# Altium footprint library 6-Connectors-4.PcbLib: 166 footprints (part 2 of 12)
Each footprint in its own frame and in the unit in brackets; x right, y up, seen from the top. Pads: shape width x height; smd on the part's side, far side on the other; paste and mask are expansions set on the pad; w line width, h text height; cw(c..) or ccw(c..) is an arc to the next point about the centre after c.
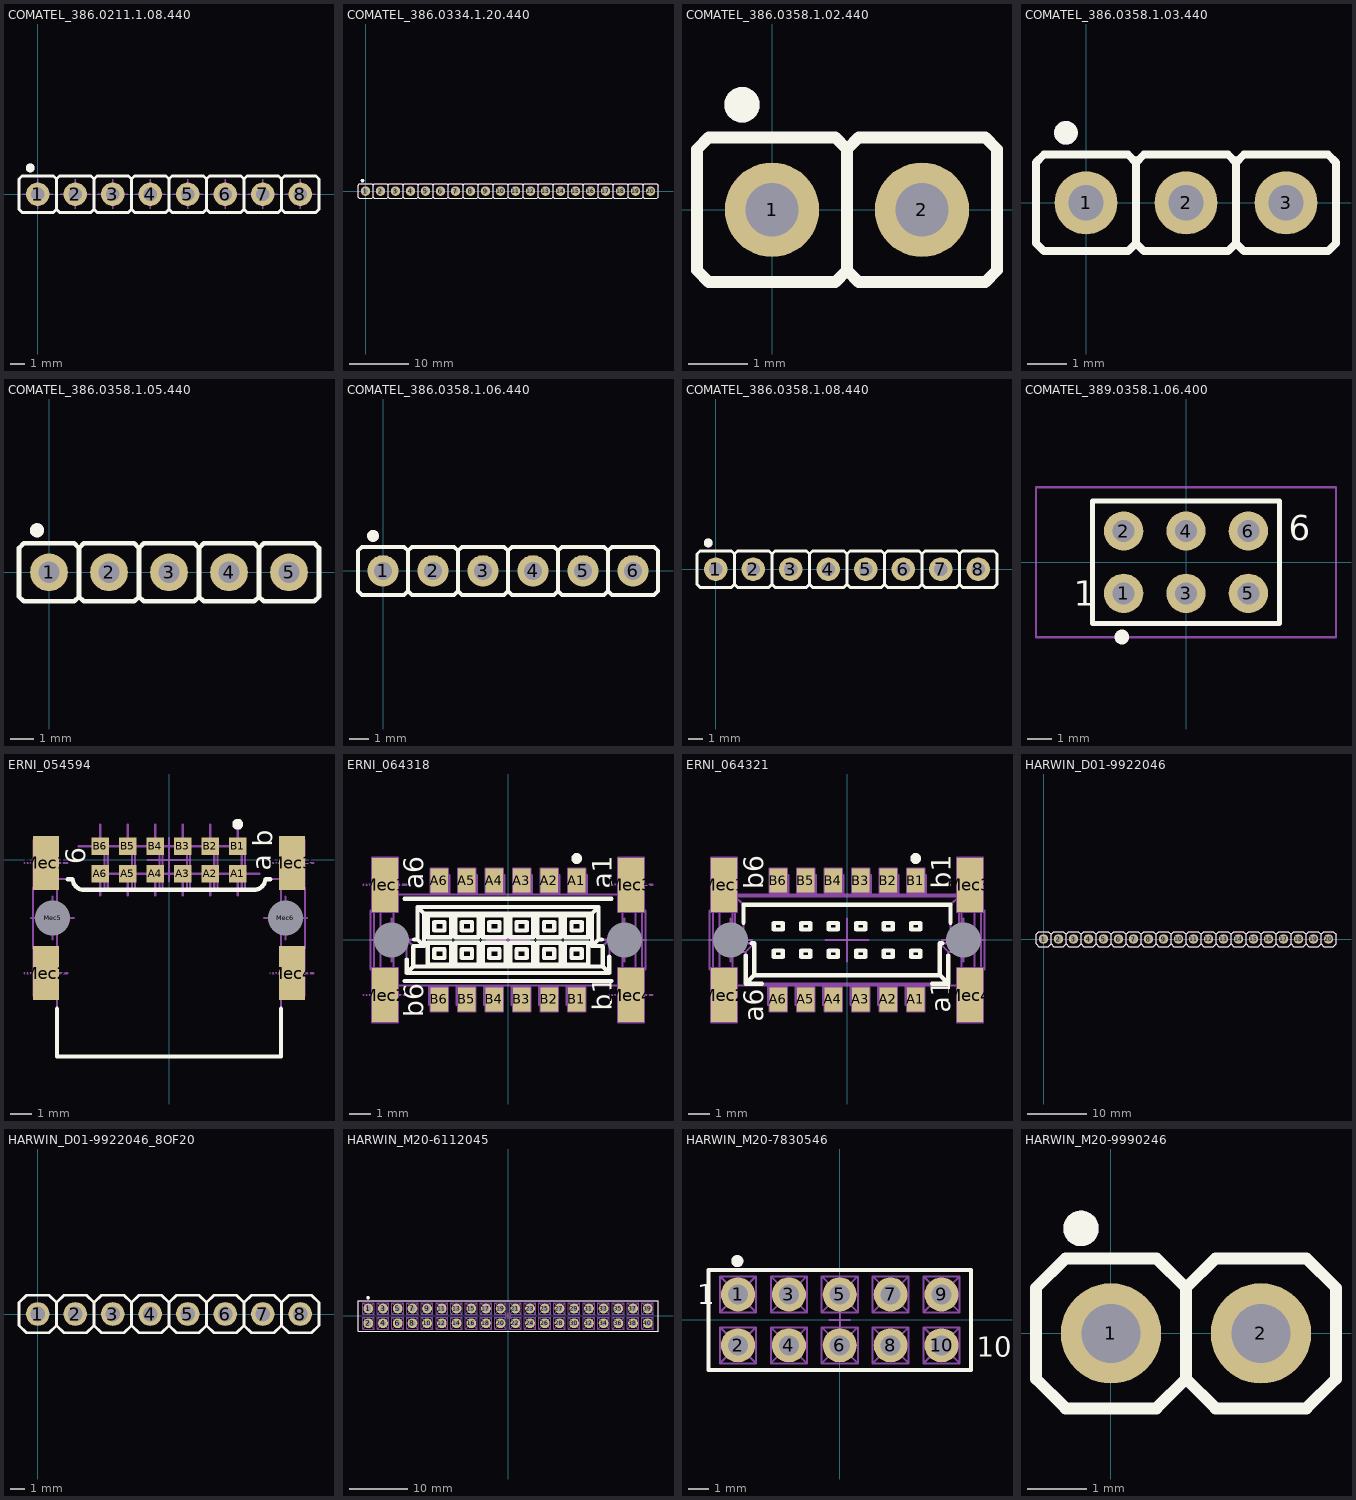
[diagram p1: the footprints below, top view; thin cyan lines are the x and y axes]

## COMATEL_386.0211.1.08.440 [mm] "Wire-Wrap contact (Pin Length= 16.5mm)"
height 18.2
pads (8):
  round 1.6 hole 0.9: 1(0,0) 2(2.54,0) 3(5.08,0) 4(7.62,0) 5(10.16,0) 6(12.7,0) 7(15.24,0) 8(17.78,0)
Top Overlay:
  circle w0.3: c-0.508,1.778 r0.15
  lines w0.2: 1.27,-1.025 1.27,1.025 ; 1.27,-1.025 1.47,-1.225 3.61,-1.225 3.81,-1.025 ; 1.27,-1.025 1.27,1.025 ; 1.27,-1.025 1.07,-1.225 -1.07,-1.225 -1.27,-1.025 -1.27,1.025 -1.07,1.225 1.07,1.225 1.27,1.025 ; 1.27,1.025 1.47,1.225 3.61,1.225 3.81,1.025 ; 3.81,-1.025 3.81,1.025 ; 3.81,-1.025 4.01,-1.225 6.15,-1.225 6.35,-1.025 ; 3.81,-1.025 3.81,1.025 ; 3.81,1.025 4.01,1.225 6.15,1.225 6.35,1.025 ; 6.35,-1.025 6.35,1.025 ; 6.35,-1.025 6.55,-1.225 8.69,-1.225 8.89,-1.025 ; 6.35,-1.025 6.35,1.025 ; 6.35,1.025 6.55,1.225 8.69,1.225 8.89,1.025 ; 8.89,-1.025 8.89,1.025 ; 8.89,-1.025 9.09,-1.225 11.23,-1.225 11.43,-1.025 ; 8.89,-1.025 8.89,1.025 ; 8.89,1.025 9.09,1.225 11.23,1.225 11.43,1.025 ; 11.43,-1.025 11.43,1.025 ; 11.43,-1.025 11.63,-1.225 13.77,-1.225 13.97,-1.025 ; 11.43,-1.025 11.43,1.025 ; 11.43,1.025 11.63,1.225 13.77,1.225 13.97,1.025 ; 13.97,-1.025 13.97,1.025 ; 13.97,-1.025 14.17,-1.225 16.31,-1.225 16.51,-1.025 ; 13.97,-1.025 13.97,1.025 ; 13.97,1.025 14.17,1.225 16.31,1.225 16.51,1.025 ; 16.51,-1.025 16.51,1.025 ; 16.51,-1.025 16.71,-1.225 18.85,-1.225 19.05,-1.025 19.05,1.025 18.85,1.225 16.71,1.225 16.51,1.025 ; 16.51,-1.025 16.51,1.025
Mechanical 8:
  lines w0.1: -1,0 0,0 ; 0,-1 0,0 ; 0,1 0,0 ; 1,0 0,0 ; 1.54,0 2.54,0 ; 2.54,-1 2.54,0 ; 2.54,1 2.54,0 ; 3.54,0 2.54,0 ; 4.08,0 5.08,0 ; 5.08,-1 5.08,0 ; 5.08,1 5.08,0 ; 6.08,0 5.08,0 ; 6.62,0 7.62,0 ; 7.62,-1 7.62,0 ; 7.62,1 7.62,0 ; 8.62,0 7.62,0 ; 9.16,0 10.16,0 ; 10.16,-1 10.16,0 ; 10.16,1 10.16,0 ; 11.16,0 10.16,0 ; 11.7,0 12.7,0 ; 12.7,-1 12.7,0 ; 12.7,1 12.7,0 ; 13.7,0 12.7,0 ; 14.24,0 15.24,0 ; 15.24,-1 15.24,0 ; 15.24,1 15.24,0 ; 16.24,0 15.24,0 ; 16.78,0 17.78,0 ; 17.78,-1 17.78,0 ; 17.78,1 17.78,0 ; 18.78,0 17.78,0
Mechanical 14:
  circle w0.3: c-0.508,1.778 r0.15
  lines w0.1: 1.27,-1.025 1.47,-1.225 3.61,-1.225 3.81,-1.025 ; 1.27,-1.025 1.27,1.025 ; 1.27,-1.025 1.07,-1.225 -1.07,-1.225 -1.27,-1.025 -1.27,1.025 -1.07,1.225 1.07,1.225 1.27,1.025 ; 1.27,-1.025 1.27,1.025 ; 1.27,1.025 1.47,1.225 3.61,1.225 3.81,1.025 ; 3.81,-1.025 4.01,-1.225 6.15,-1.225 6.35,-1.025 ; 3.81,-1.025 3.81,1.025 ; 3.81,-1.025 3.81,1.025 ; 3.81,1.025 4.01,1.225 6.15,1.225 6.35,1.025 ; 6.35,-1.025 6.55,-1.225 8.69,-1.225 8.89,-1.025 ; 6.35,-1.025 6.35,1.025 ; 6.35,-1.025 6.35,1.025 ; 6.35,1.025 6.55,1.225 8.69,1.225 8.89,1.025 ; 8.89,-1.025 9.09,-1.225 11.23,-1.225 11.43,-1.025 ; 8.89,-1.025 8.89,1.025 ; 8.89,-1.025 8.89,1.025 ; 8.89,1.025 9.09,1.225 11.23,1.225 11.43,1.025 ; 11.43,-1.025 11.63,-1.225 13.77,-1.225 13.97,-1.025 ; 11.43,-1.025 11.43,1.025 ; 11.43,-1.025 11.43,1.025 ; 11.43,1.025 11.63,1.225 13.77,1.225 13.97,1.025 ; 13.97,-1.025 14.17,-1.225 16.31,-1.225 16.51,-1.025 ; 13.97,-1.025 13.97,1.025 ; 13.97,-1.025 13.97,1.025 ; 13.97,1.025 14.17,1.225 16.31,1.225 16.51,1.025 ; 16.51,-1.025 16.71,-1.225 18.85,-1.225 19.05,-1.025 19.05,1.025 18.85,1.225 16.71,1.225 16.51,1.025 ; 16.51,-1.025 16.51,1.025 ; 16.51,-1.025 16.51,1.025
3D body "COMATEL_386.0211.1.08.440.stp": height 18.2, standoff -3.8, extent -1.27,-1.225 19.05,1.225

## COMATEL_386.0334.1.20.440 [mm] "Wire-Wrap contact (Pin Length= 7.5mm)"
height 9.2
pads (20):
  round 1.6 hole 0.9: 1(0,0) 2(2.54,0) 3(5.08,0) 4(7.62,0) 5(10.16,0) 6(12.7,0) 7(15.24,0) 8(17.78,0) 9(20.32,0) 10(22.86,0) 11(25.4,0) 12(27.94,0) 13(30.48,0) 14(33.02,0) 15(35.56,0) 16(38.1,0) 17(40.64,0) 18(43.18,0) 19(45.72,0) 20(48.26,0)
Top Overlay:
  drawing of 161 lines, arcs and shapes, not listed
Mechanical 14:
  drawing of 161 lines, arcs and shapes, not listed
3D body "COMATEL_386.0334.1.20.440.stp": height 9.2, standoff -3.3, extent -1.27,-1.225 49.53,1.225

## COMATEL_386.0358.1.02.440 [mm] "2 Contacts Straight Strip Header Pitch 2.54mm L=6.3mm ''Mini-Wire-Wrap''"
height 8
pads (2):
  round 1.6 hole 0.9: 1(0,0) 2(2.54,0)
Top Overlay:
  circle w0.3: c-0.508,1.778 r0.15
  lines w0.2: 1.27,-1.025 1.07,-1.225 -1.07,-1.225 -1.27,-1.025 -1.27,1.025 -1.07,1.225 1.07,1.225 1.27,1.025 ; 1.27,-1.025 1.27,1.025 ; 1.27,-1.025 1.47,-1.225 3.61,-1.225 3.81,-1.025 3.81,1.025 3.61,1.225 1.47,1.225 1.27,1.025
Mechanical 14:
  circle w0.3: c-0.508,1.778 r0.15
  lines w0.1: 1.27,-1.025 1.07,-1.225 -1.07,-1.225 -1.27,-1.025 -1.27,1.025 -1.07,1.225 1.07,1.225 1.27,1.025 ; 1.27,-1.025 1.27,1.025 ; 1.27,-1.025 1.47,-1.225 3.61,-1.225 3.81,-1.025 3.81,1.025 3.61,1.225 1.47,1.225 1.27,1.025
3D body "COMATEL_386.0358.1.02.440.stp": height 8, standoff -3.2, extent -1.27,-1.225 3.81,1.225

## COMATEL_386.0358.1.03.440 [mm] "3 Contacts Straight Strip Header Pitch 2.54mm L=6.3mm ''Mini-Wire-Wrap''"
height 8
pads (3):
  round 1.6 hole 0.9: 1(0,0) 2(2.54,0) 3(5.08,0)
Top Overlay:
  circle w0.3: c-0.508,1.778 r0.15
  lines w0.2: 1.27,-1.025 1.07,-1.225 -1.07,-1.225 -1.27,-1.025 -1.27,1.025 -1.07,1.225 1.07,1.225 1.27,1.025 ; 1.27,-1.025 1.27,1.025 ; 1.27,-1.025 1.47,-1.225 3.61,-1.225 3.81,-1.025 ; 1.27,1.025 1.47,1.225 3.61,1.225 3.81,1.025 ; 3.81,-1.025 3.81,1.025 ; 3.81,-1.025 4.01,-1.225 6.15,-1.225 6.35,-1.025 6.35,1.025 6.15,1.225 4.01,1.225 3.81,1.025
Mechanical 14:
  circle w0.3: c-0.508,1.778 r0.15
  lines w0.1: 1.27,-1.025 1.07,-1.225 -1.07,-1.225 -1.27,-1.025 -1.27,1.025 -1.07,1.225 1.07,1.225 1.27,1.025 ; 1.27,-1.025 1.27,1.025 ; 1.27,-1.025 1.47,-1.225 3.61,-1.225 3.81,-1.025 ; 1.27,1.025 1.47,1.225 3.61,1.225 3.81,1.025 ; 3.81,-1.025 3.81,1.025 ; 3.81,-1.025 4.01,-1.225 6.15,-1.225 6.35,-1.025 6.35,1.025 6.15,1.225 4.01,1.225 3.81,1.025
3D body "COMATEL_386.0358.1.03.440.stp": height 8, standoff -3.2, extent -1.27,-1.225 6.35,1.225

## COMATEL_386.0358.1.05.440 [mm] "5 Contacts Straight Strip Header Pitch 2.54mm L=6.3mm ''Mini-Wire-Wrap''"
height 8
pads (5):
  round 1.6 hole 0.9: 1(0,0) 2(2.54,0) 3(5.08,0) 4(7.62,0) 5(10.16,0)
Top Overlay:
  circle w0.3: c-0.508,1.778 r0.15
  lines w0.2: 1.27,-1.025 1.47,-1.225 3.61,-1.225 3.81,-1.025 ; 1.27,-1.025 1.27,1.025 ; 1.27,-1.025 1.07,-1.225 -1.07,-1.225 -1.27,-1.025 -1.27,1.025 -1.07,1.225 1.07,1.225 1.27,1.025 ; 1.27,1.025 1.47,1.225 3.61,1.225 3.81,1.025 ; 3.81,-1.025 4.01,-1.225 6.15,-1.225 6.35,-1.025 ; 3.81,-1.025 3.81,1.025 ; 3.81,1.025 4.01,1.225 6.15,1.225 6.35,1.025 ; 6.35,-1.025 6.55,-1.225 8.69,-1.225 8.89,-1.025 ; 6.35,-1.025 6.35,1.025 ; 6.35,1.025 6.55,1.225 8.69,1.225 8.89,1.025 ; 8.89,-1.025 8.89,1.025 ; 8.89,-1.025 9.09,-1.225 11.23,-1.225 11.43,-1.025 11.43,1.025 11.23,1.225 9.09,1.225 8.89,1.025
Mechanical 14:
  circle w0.3: c-0.508,1.778 r0.15
  lines w0.1: 1.27,-1.025 1.47,-1.225 3.61,-1.225 3.81,-1.025 ; 1.27,-1.025 1.27,1.025 ; 1.27,-1.025 1.07,-1.225 -1.07,-1.225 -1.27,-1.025 -1.27,1.025 -1.07,1.225 1.07,1.225 1.27,1.025 ; 1.27,1.025 1.47,1.225 3.61,1.225 3.81,1.025 ; 3.81,-1.025 4.01,-1.225 6.15,-1.225 6.35,-1.025 ; 3.81,-1.025 3.81,1.025 ; 3.81,1.025 4.01,1.225 6.15,1.225 6.35,1.025 ; 6.35,-1.025 6.35,1.025 ; 6.35,-1.025 6.55,-1.225 8.69,-1.225 8.89,-1.025 ; 6.35,1.025 6.55,1.225 8.69,1.225 8.89,1.025 ; 8.89,-1.025 8.89,1.025 ; 8.89,-1.025 9.09,-1.225 11.23,-1.225 11.43,-1.025 11.43,1.025 11.23,1.225 9.09,1.225 8.89,1.025
3D body "COMATEL_386.0358.1.05.440.stp": height 8, standoff -3.2, extent -1.27,-1.225 11.43,1.225

## COMATEL_386.0358.1.06.440 [mm] "6 Contacts Straight Strip Header Pitch 2.54mm L=6.3mm ''Mini-Wire-Wrap''"
height 8
pads (6):
  round 1.6 hole 0.9: 1(0,0) 2(2.54,0) 3(5.08,0) 4(7.62,0) 5(10.16,0) 6(12.7,0)
Top Overlay:
  circle w0.3: c-0.508,1.778 r0.15
  lines w0.2: 1.27,-1.025 1.47,-1.225 3.61,-1.225 3.81,-1.025 ; 1.27,-1.025 1.27,1.025 ; 1.27,-1.025 1.07,-1.225 -1.07,-1.225 -1.27,-1.025 -1.27,1.025 -1.07,1.225 1.07,1.225 1.27,1.025 ; 1.27,1.025 1.47,1.225 3.61,1.225 3.81,1.025 ; 3.81,-1.025 4.01,-1.225 6.15,-1.225 6.35,-1.025 ; 3.81,-1.025 3.81,1.025 ; 3.81,1.025 4.01,1.225 6.15,1.225 6.35,1.025 ; 6.35,-1.025 6.55,-1.225 8.69,-1.225 8.89,-1.025 ; 6.35,-1.025 6.35,1.025 ; 6.35,1.025 6.55,1.225 8.69,1.225 8.89,1.025 ; 8.89,-1.025 8.89,1.025 ; 8.89,-1.025 9.09,-1.225 11.23,-1.225 11.43,-1.025 ; 8.89,1.025 9.09,1.225 11.23,1.225 11.43,1.025 ; 11.43,-1.025 11.43,1.025 ; 11.43,-1.025 11.63,-1.225 13.77,-1.225 13.97,-1.025 13.97,1.025 13.77,1.225 11.63,1.225 11.43,1.025
Mechanical 14:
  circle w0.3: c-0.508,1.778 r0.15
  lines w0.1: 1.27,-1.025 1.47,-1.225 3.61,-1.225 3.81,-1.025 ; 1.27,-1.025 1.27,1.025 ; 1.27,-1.025 1.07,-1.225 -1.07,-1.225 -1.27,-1.025 -1.27,1.025 -1.07,1.225 1.07,1.225 1.27,1.025 ; 1.27,1.025 1.47,1.225 3.61,1.225 3.81,1.025 ; 3.81,-1.025 4.01,-1.225 6.15,-1.225 6.35,-1.025 ; 3.81,-1.025 3.81,1.025 ; 3.81,1.025 4.01,1.225 6.15,1.225 6.35,1.025 ; 6.35,-1.025 6.35,1.025 ; 6.35,-1.025 6.55,-1.225 8.69,-1.225 8.89,-1.025 ; 6.35,1.025 6.55,1.225 8.69,1.225 8.89,1.025 ; 8.89,-1.025 8.89,1.025 ; 8.89,-1.025 9.09,-1.225 11.23,-1.225 11.43,-1.025 ; 8.89,1.025 9.09,1.225 11.23,1.225 11.43,1.025 ; 11.43,-1.025 11.43,1.025 ; 11.43,-1.025 11.63,-1.225 13.77,-1.225 13.97,-1.025 13.97,1.025 13.77,1.225 11.63,1.225 11.43,1.025
3D body "COMATEL_386.0358.1.06.440.stp": height 8, standoff -3.2, extent -1.27,-1.225 13.97,1.225

## COMATEL_386.0358.1.08.440 [mm] "8 Contacts Straight Strip Header Pitch 2.54mm L=6.3mm ''Mini-Wire-Wrap''"
height 8
pads (8):
  round 1.6 hole 0.9: 1(0,0) 2(2.54,0) 3(5.08,0) 4(7.62,0) 5(10.16,0) 6(12.7,0) 7(15.24,0) 8(17.78,0)
Top Overlay:
  circle w0.3: c-0.508,1.778 r0.15
  lines w0.2: 1.27,-1.025 1.47,-1.225 3.61,-1.225 3.81,-1.025 ; 1.27,-1.025 1.27,1.025 ; 1.27,-1.025 1.07,-1.225 -1.07,-1.225 -1.27,-1.025 -1.27,1.025 -1.07,1.225 1.07,1.225 1.27,1.025 ; 1.27,1.025 1.47,1.225 3.61,1.225 3.81,1.025 ; 3.81,-1.025 4.01,-1.225 6.15,-1.225 6.35,-1.025 ; 3.81,-1.025 3.81,1.025 ; 3.81,1.025 4.01,1.225 6.15,1.225 6.35,1.025 ; 6.35,-1.025 6.55,-1.225 8.69,-1.225 8.89,-1.025 ; 6.35,-1.025 6.35,1.025 ; 6.35,1.025 6.55,1.225 8.69,1.225 8.89,1.025 ; 8.89,-1.025 9.09,-1.225 11.23,-1.225 11.43,-1.025 ; 8.89,-1.025 8.89,1.025 ; 8.89,1.025 9.09,1.225 11.23,1.225 11.43,1.025 ; 11.43,-1.025 11.63,-1.225 13.77,-1.225 13.97,-1.025 ; 11.43,-1.025 11.43,1.025 ; 11.43,1.025 11.63,1.225 13.77,1.225 13.97,1.025 ; 13.97,-1.025 14.17,-1.225 16.31,-1.225 16.51,-1.025 ; 13.97,-1.025 13.97,1.025 ; 13.97,1.025 14.17,1.225 16.31,1.225 16.51,1.025 ; 16.51,-1.025 16.71,-1.225 18.85,-1.225 19.05,-1.025 19.05,1.025 18.85,1.225 16.71,1.225 16.51,1.025 ; 16.51,-1.025 16.51,1.025
Mechanical 14:
  circle w0.3: c-0.508,1.778 r0.15
  lines w0.1: 1.27,-1.025 1.47,-1.225 3.61,-1.225 3.81,-1.025 ; 1.27,-1.025 1.07,-1.225 -1.07,-1.225 -1.27,-1.025 -1.27,1.025 -1.07,1.225 1.07,1.225 1.27,1.025 ; 1.27,-1.025 1.27,1.025 ; 1.27,1.025 1.47,1.225 3.61,1.225 3.81,1.025 ; 3.81,-1.025 4.01,-1.225 6.15,-1.225 6.35,-1.025 ; 3.81,-1.025 3.81,1.025 ; 3.81,1.025 4.01,1.225 6.15,1.225 6.35,1.025 ; 6.35,-1.025 6.55,-1.225 8.69,-1.225 8.89,-1.025 ; 6.35,-1.025 6.35,1.025 ; 6.35,1.025 6.55,1.225 8.69,1.225 8.89,1.025 ; 8.89,-1.025 9.09,-1.225 11.23,-1.225 11.43,-1.025 ; 8.89,-1.025 8.89,1.025 ; 8.89,1.025 9.09,1.225 11.23,1.225 11.43,1.025 ; 11.43,-1.025 11.63,-1.225 13.77,-1.225 13.97,-1.025 ; 11.43,-1.025 11.43,1.025 ; 11.43,1.025 11.63,1.225 13.77,1.225 13.97,1.025 ; 13.97,-1.025 14.17,-1.225 16.31,-1.225 16.51,-1.025 ; 13.97,-1.025 13.97,1.025 ; 13.97,1.025 14.17,1.225 16.31,1.225 16.51,1.025 ; 16.51,-1.025 16.71,-1.225 18.85,-1.225 19.05,-1.025 19.05,1.025 18.85,1.225 16.71,1.225 16.51,1.025 ; 16.51,-1.025 16.51,1.025
3D body "COMATEL_386.0358.1.08.440.stp": height 8, standoff -3.2, extent -1.27,-1.225 19.05,1.225

## COMATEL_389.0358.1.06.400 [mm] "6 Contacts - Pitch 2.54mm - Dual Row Straight Strip Header - Insulator 1.7mm"
height 8
pads (6):
  round 1.6 hole 0.9: 1(-2.54,-1.27) 2(-2.54,1.27) 3(0,-1.27) 4(0,1.27) 5(2.54,-1.27) 6(2.54,1.27)
Top Overlay:
  circle w0.3: c-2.613,-3.048 r0.15
  lines w0.2: -3.81,-2.5 3.81,-2.5 3.81,2.5 -3.81,2.5 -3.81,-2.5
  text "1" at -4.572,-1.778 h1.02
  text "6" at 4.191,0.889 h1.02
Mechanical 8:
  lines w0.1: -6.11,-3.05 6.11,-3.05 6.11,3.05 -6.11,3.05 -6.11,-3.05
Mechanical 14:
  lines w0.1: -3.81,-2.5 -3.81,2.5 3.81,2.5 3.81,-2.5 -3.81,-2.5
3D body "COMATEL_389.0358.1.06.400.stp": height 8, standoff -3.2, extent -3.81,-3 3.81,2.5

## ERNI_054594 [mm] "12 Contacts Pitch 1.27  SMC Right Angle Male Connector Type B"
height 4.2
pads (18):
  rect 0.8x0.8 smd: A1(3.175,-0.635) A2(1.905,-0.635) A3(0.635,-0.635) A4(-0.635,-0.635) A5(-1.905,-0.635) A6(-3.175,-0.635) B1(3.175,0.635) B2(1.905,0.635) B3(0.635,0.635) B4(-0.635,0.635) B5(-1.905,0.635) B6(-3.175,0.635)
  rect 1.2x2.5 smd: Mec1(-5.685,-0.135) Mec2(-5.685,-5.235) Mec3(5.685,-0.135) Mec4(5.685,-5.235)
  round 1 hole 1.6 unplated mask+0.4: Mec5(-5.385,-2.685) Mec6(5.385,-2.685)
Top Overlay:
  circle w0.25: c3.175,1.651 r0.125
  lines w0.2: -5.175,-6.885 -5.175,-9.085 5.175,-9.085 5.175,-6.885 ; -4.685,-0.885 -4.475,-0.885 -4.413,-1.055 ccw(c-3.942,-0.884) -3.941,-1.385 3.941,-1.385 ccw(c3.942,-0.884) 4.413,-1.054 4.475,-0.885 4.685,-0.885
  text "6" at -3.875,-0.2 h0.9
  text "b" at 4.78,0.6 h0.9
  text "a" at 4.725,-0.5 h0.9
Mechanical 8:
  lines w0.1: -6.685,-5.235 -5.685,-5.235 ; -6.685,-0.135 -5.685,-0.135 ; -6.385,-2.685 -5.385,-2.685 ; -5.685,-6.235 -5.685,-5.235 ; -5.685,-4.235 -5.685,-5.235 ; -5.685,-1.135 -5.685,-0.135 ; -5.685,0.865 -5.685,-0.135 ; -5.385,-3.685 -5.385,-2.685 ; -5.385,-1.685 -5.385,-2.685 ; -4.685,-5.235 -5.685,-5.235 ; -4.685,-0.135 -5.685,-0.135 ; -4.385,-2.685 -5.385,-2.685 ; -4.175,0.635 -3.175,0.635 -3.175,1.635 ; -3.175,-1.635 -3.175,-0.635 -2.175,-0.635 ; -2.905,0.635 -1.905,0.635 -1.905,1.635 ; -1.905,-1.635 -1.905,-0.635 -0.905,-0.635 ; -1.635,0.635 -0.635,0.635 -0.635,1.635 ; -1,0 0,0 ; -0.635,-1.635 -0.635,-0.635 0.365,-0.635 ; -0.365,0.635 0.635,0.635 0.635,1.635 ; 0,-1 0,0 ; 0,1 0,0 ; 0.635,-1.635 0.635,-0.635 1.635,-0.635 ; 0.905,0.635 1.905,0.635 1.905,1.635 ; 1,0 0,0 ; 1.905,-1.635 1.905,-0.635 2.905,-0.635 ; 2.175,0.635 3.175,0.635 3.175,1.635 ; 3.175,-1.635 3.175,-0.635 4.175,-0.635 ; 4.385,-2.685 5.385,-2.685 ; 4.685,-5.235 5.685,-5.235 ; 4.685,-0.135 5.685,-0.135 ; 5.385,-3.685 5.385,-2.685 ; 5.385,-1.685 5.385,-2.685 ; 5.685,-6.235 5.685,-5.235 ; 5.685,-4.235 5.685,-5.235 ; 5.685,-1.135 5.685,-0.135 ; 5.685,0.865 5.685,-0.135 ; 6.385,-2.685 5.385,-2.685 ; 6.685,-5.235 5.685,-5.235 ; 6.685,-0.135 5.685,-0.135
Mechanical 14:
  lines w0.1: -5.585,-4.135 -6.255,-4.135 -6.255,-6.285 -5.255,-6.285 -5.255,-5.785 -5.255,-5.485 ; -5.585,-4.085 -5.585,-5.485 -5.185,-5.485 -5.185,0.115 -5.255,0.115 ; -5.585,-1.285 -5.585,0.115 -5.255,0.115 ; -5.585,-1.235 -6.255,-1.235 -6.255,0.915 -5.255,0.915 -5.255,0.115 ; -5.185,-4.085 -6.285,-4.085 -6.285,-1.285 -5.185,-1.285 ; -3.345,-0.838 -3.345,-0.538 ; -3.345,0.433 -3.345,0.733 ; -3.245,-0.938 -2.985,-0.938 ; -3.245,-0.438 -2.985,-0.438 ; -3.245,0.333 -2.985,0.333 ; -3.245,0.833 -2.985,0.833 ; -2.985,-1.385 -2.985,0.833 ; -2.835,-1.385 -2.835,0.833 -2.985,0.833 ; -2.075,-0.838 -2.075,-0.538 ; -2.075,0.433 -2.075,0.733 ; -1.975,-0.938 -1.715,-0.938 ; -1.975,-0.438 -1.715,-0.438 ; -1.975,0.333 -1.715,0.333 ; -1.975,0.833 -1.715,0.833 ; -1.715,-1.385 -1.715,0.833 ; -1.565,-1.385 -1.565,0.833 -1.715,0.833 ; -0.805,-0.838 -0.805,-0.538 ; -0.805,0.433 -0.805,0.733 ; -0.705,-0.938 -0.445,-0.938 ; -0.705,-0.438 -0.445,-0.438 ; -0.705,0.333 -0.445,0.333 ; -0.705,0.833 -0.445,0.833 ; -0.445,-1.385 -0.445,0.833 ; -0.295,-1.385 -0.295,0.833 -0.445,0.833 ; 0.465,-0.838 0.465,-0.538 ; 0.465,0.433 0.465,0.733 ; 0.565,-0.938 0.825,-0.938 ; 0.565,-0.438 0.825,-0.438 ; 0.565,0.333 0.825,0.333 ; 0.565,0.833 0.825,0.833 ; 0.825,-1.385 0.825,0.833 ; 0.975,-1.385 0.975,0.833 0.825,0.833 ; 1.735,-0.838 1.735,-0.538 ; 1.735,0.433 1.735,0.733 ; 1.835,-0.938 2.095,-0.938 ; 1.835,-0.438 2.095,-0.438 ; 1.835,0.333 2.095,0.333 ; 1.835,0.833 2.095,0.833 ; 2.095,-1.385 2.095,0.833 ; 2.245,-1.385 2.245,0.833 2.095,0.833 ; 3.005,-0.838 3.005,-0.538 ; 3.005,0.433 3.005,0.733 ; 3.105,-0.938 3.365,-0.938 ; 3.105,-0.438 3.365,-0.438 ; 3.105,0.333 3.365,0.333 ; 3.105,0.833 3.365,0.833 ; 3.365,-1.385 3.365,0.833 ; 3.515,-1.385 3.515,0.833 3.365,0.833 ; 5.185,-4.085 6.285,-4.085 6.285,-1.285 5.185,-1.285 ; 5.255,-5.485 5.255,-5.785 5.255,-6.285 6.255,-6.285 6.255,-4.135 5.585,-4.135 ; 5.585,-4.085 5.585,-5.485 5.185,-5.485 5.185,0.115 5.255,0.115 ; 5.585,-1.285 5.585,0.115 5.255,0.115 ; 5.585,-1.235 6.255,-1.235 6.255,0.915 5.255,0.915 5.255,0.115 ; -5.175,-9.085 -5.175,-0.885 -4.475,-0.885 -4.413,-1.055 ccw(c-3.942,-0.884) -3.941,-1.385 3.941,-1.385 ccw(c3.942,-0.884) 4.413,-1.054 4.475,-0.885 5.175,-0.885 5.175,-9.085 -5.175,-9.085
  text "6" at -3.875,-0.2 h0.9
  text "a" at 4.725,-0.5 h0.9
  text "b" at 4.78,0.6 h0.9
  text "a1" at 2.7,-2.8 h1
  text "a6" at -4,-2.8 h1
3D body "p080-080.stp": height 0.02, standoff 0, extent 2.775,-1.035 3.575,-0.235
3D body "p080-080.stp": height 0.02, standoff 0, extent 2.775,0.235 3.575,1.035
3D body "p080-080.stp": height 0.02, standoff 0, extent 1.505,-1.035 2.305,-0.235
3D body "p080-080.stp": height 0.02, standoff 0, extent 1.505,0.235 2.305,1.035
3D body "p080-080.stp": height 0.02, standoff 0, extent 0.235,-1.035 1.035,-0.235
3D body "p080-080.stp": height 0.02, standoff 0, extent 0.235,0.235 1.035,1.035
3D body "p080-080.stp": height 0.02, standoff 0, extent -1.035,-1.035 -0.235,-0.235
3D body "p080-080.stp": height 0.02, standoff 0, extent -1.035,0.235 -0.235,1.035
3D body "p080-080.stp": height 0.02, standoff 0, extent -2.305,-1.035 -1.505,-0.235
3D body "p080-080.stp": height 0.02, standoff 0, extent -2.305,0.235 -1.505,1.035
3D body "p080-080.stp": height 0.02, standoff 0, extent -3.575,-1.035 -2.775,-0.235
3D body "p080-080.stp": height 0.02, standoff 0, extent -3.575,0.235 -2.775,1.035
3D body "ERNI_054594.stp": height 4.25, standoff -0.7, extent -6.285,-9.085 6.285,0.915
3D body "p250-120.stp": height 0.02, standoff 0, extent 5.115,-1.377 6.315,1.123
3D body "p250-120.stp": height 0.02, standoff 0, extent 5.115,-6.457 6.315,-3.957
3D body "p250-120.stp": height 0.02, standoff 0, extent -6.315,-1.377 -5.115,1.123
3D body "p250-120.stp": height 0.02, standoff 0, extent -6.315,-6.457 -5.115,-3.957
3D body "p250-120.stp": height 0.02, standoff 0, extent -6.285,-6.485 -5.085,-3.985
3D body "p250-120.stp": height 0.02, standoff 0, extent -6.285,-1.385 -5.085,1.115
3D body "p250-120.stp": height 0.02, standoff 0, extent 5.085,-6.485 6.285,-3.985
3D body "p250-120.stp": height 0.02, standoff 0, extent 5.085,-1.385 6.285,1.115
3D body "p080-080.stp": height 0.02, standoff 0, extent -3.575,0.235 -2.775,1.035
3D body "p080-080.stp": height 0.02, standoff 0, extent -2.305,0.235 -1.505,1.035
3D body "p080-080.stp": height 0.02, standoff 0, extent -1.035,0.235 -0.235,1.035
3D body "p080-080.stp": height 0.02, standoff 0, extent 0.235,0.235 1.035,1.035
3D body "p080-080.stp": height 0.02, standoff 0, extent 1.505,0.235 2.305,1.035
3D body "p080-080.stp": height 0.02, standoff 0, extent 2.775,0.235 3.575,1.035
3D body "p080-080.stp": height 0.02, standoff 0, extent -3.575,-1.035 -2.775,-0.235
3D body "p080-080.stp": height 0.02, standoff 0, extent -2.305,-1.035 -1.505,-0.235
3D body "p080-080.stp": height 0.02, standoff 0, extent -1.035,-1.035 -0.235,-0.235
3D body "p080-080.stp": height 0.02, standoff 0, extent 0.235,-1.035 1.035,-0.235
3D body "p080-080.stp": height 0.02, standoff 0, extent 1.505,-1.035 2.305,-0.235
3D body "p080-080.stp": height 0.02, standoff 0, extent 2.775,-1.035 3.575,-0.235

## ERNI_064318 [mm] "12 Contacts Pitch 1.27  SMC Vertical Female Connector Type B"
height 6.2
pads (18):
  rect 0.8x1.1 smd: A1(3.175,2.75) A2(1.905,2.75) A3(0.635,2.75) A4(-0.635,2.75) A5(-1.905,2.75) A6(-3.175,2.75) B1(3.175,-2.75) B2(1.905,-2.75) B3(0.635,-2.75) B4(-0.635,-2.75) B5(-1.905,-2.75) B6(-3.175,-2.75)
  rect 1.2x2.5 smd: Mec1(-5.685,2.55) Mec2(-5.685,-2.55) Mec3(5.685,2.55) Mec4(5.685,-2.55)
  round 1 hole 1.6 unplated mask+0.6: Mech5(-5.385,0) Mech6(5.385,0)
Top Overlay:
  circle w0.25: c3.175,3.766 r0.125
  lines w0.2: -4.785,-1.9 4.785,-1.9 ; -4.785,1.9 4.785,1.9 ; -4.685,-0.9 -4.685,-1.525 ; -4.385,-0.32 -4.385,-1.225 ; -4.372,-0.275 -3.885,-0.275 ; -4.335,0.025 -4.185,0.025 -4.185,1.525 ; -4.185,0.025 -3.885,-0.275 ; 4.185,0.025 3.885,-0.275 ; 4.335,0.025 4.185,0.025 4.185,1.525 ; 4.372,-0.275 3.885,-0.275 ; 4.385,-0.32 4.385,-1.225 ; 4.685,-0.783 4.685,-1.525 ; -4.685,-1.525 4.685,-1.525 ; -4.685,-1.525 -4.385,-1.225 ; -4.385,-1.225 4.385,-1.225 ; -4.185,1.525 -3.885,1.225 ; -4.185,1.525 4.185,1.525 ; -3.885,-0.275 -3.885,1.225 ; -3.885,1.225 3.885,1.225 ; -1.173,0.125 -1.173,1.135 ; -1.173,0.125 -0.097,0.125 ; -1.173,0.125 -1.173,1.135 ; -1.173,0.125 -0.097,0.125 ; -1.173,1.135 -0.097,1.135 ; -1.173,1.135 -0.097,1.135 ; -0.873,0.435 -0.873,0.835 ; -0.873,0.435 -0.397,0.435 ; -0.873,0.435 -0.873,0.835 ; -0.873,0.435 -0.397,0.435 ; -0.873,0.835 -0.397,0.835 ; -0.873,0.835 -0.397,0.835 ; -0.397,0.435 -0.397,0.835 ; -0.397,0.435 -0.397,0.835 ; -0.097,0.125 -0.097,1.135 ; -0.097,0.125 -0.097,1.135 ; 3.885,-0.275 3.885,1.225 ; 3.885,1.225 4.185,1.525 ; 4.385,-1.225 4.685,-1.525 ; -3.713,-1.145 -3.713,-0.135 -2.637,-0.135 -2.637,-1.145 -3.713,-1.145 ; -3.713,0.125 -3.713,1.135 -2.637,1.135 -2.637,0.125 -3.713,0.125 ; -3.413,-0.835 -3.413,-0.435 -2.937,-0.435 -2.937,-0.835 -3.413,-0.835 ; -3.413,0.435 -3.413,0.835 -2.937,0.835 -2.937,0.435 -3.413,0.435 ; -2.443,-1.145 -2.443,-0.135 -1.367,-0.135 -1.367,-1.145 -2.443,-1.145 ; -2.443,0.125 -2.443,1.135 -1.367,1.135 -1.367,0.125 -2.443,0.125 ; -2.143,-0.835 -2.143,-0.435 -1.667,-0.435 -1.667,-0.835 -2.143,-0.835 ; -2.143,0.435 -2.143,0.835 -1.667,0.835 -1.667,0.435 -2.143,0.435 ; -1.173,-1.145 -1.173,-0.135 -0.097,-0.135 -0.097,-1.145 -1.173,-1.145 ; -0.873,-0.835 -0.873,-0.435 -0.397,-0.435 -0.397,-0.835 -0.873,-0.835 ; 0.097,-1.145 0.097,-0.135 1.173,-0.135 1.173,-1.145 0.097,-1.145 ; 0.097,0.125 0.097,1.135 1.173,1.135 1.173,0.125 0.097,0.125 ; 0.397,-0.835 0.397,-0.435 0.873,-0.435 0.873,-0.835 0.397,-0.835 ; 0.397,0.435 0.397,0.835 0.873,0.835 0.873,0.435 0.397,0.435 ; 1.367,-1.145 1.367,-0.135 2.443,-0.135 2.443,-1.145 1.367,-1.145 ; 1.367,0.125 1.367,1.135 2.443,1.135 2.443,0.125 1.367,0.125 ; 1.667,-0.835 1.667,-0.435 2.143,-0.435 2.143,-0.835 1.667,-0.835 ; 1.667,0.435 1.667,0.835 2.143,0.835 2.143,0.435 1.667,0.435 ; 2.637,-1.145 2.637,-0.135 3.713,-0.135 3.713,-1.145 2.637,-1.145 ; 2.637,0.125 2.637,1.135 3.713,1.135 3.713,0.125 2.637,0.125 ; 2.937,-0.835 2.937,-0.435 3.413,-0.435 3.413,-0.835 2.937,-0.835 ; 2.937,0.435 2.937,0.835 3.413,0.835 3.413,0.435 2.937,0.435